# Altium footprint library std-th.PcbLib: 171 footprints (part 7 of 11)
Each footprint in its own frame and in the unit in brackets; x right, y up, seen from the top. Pads: shape width x height; smd on the part's side, far side on the other; paste and mask are expansions set on the pad; w line width, h text height; cw(c..) or ccw(c..) is an arc to the next point about the centre after c.
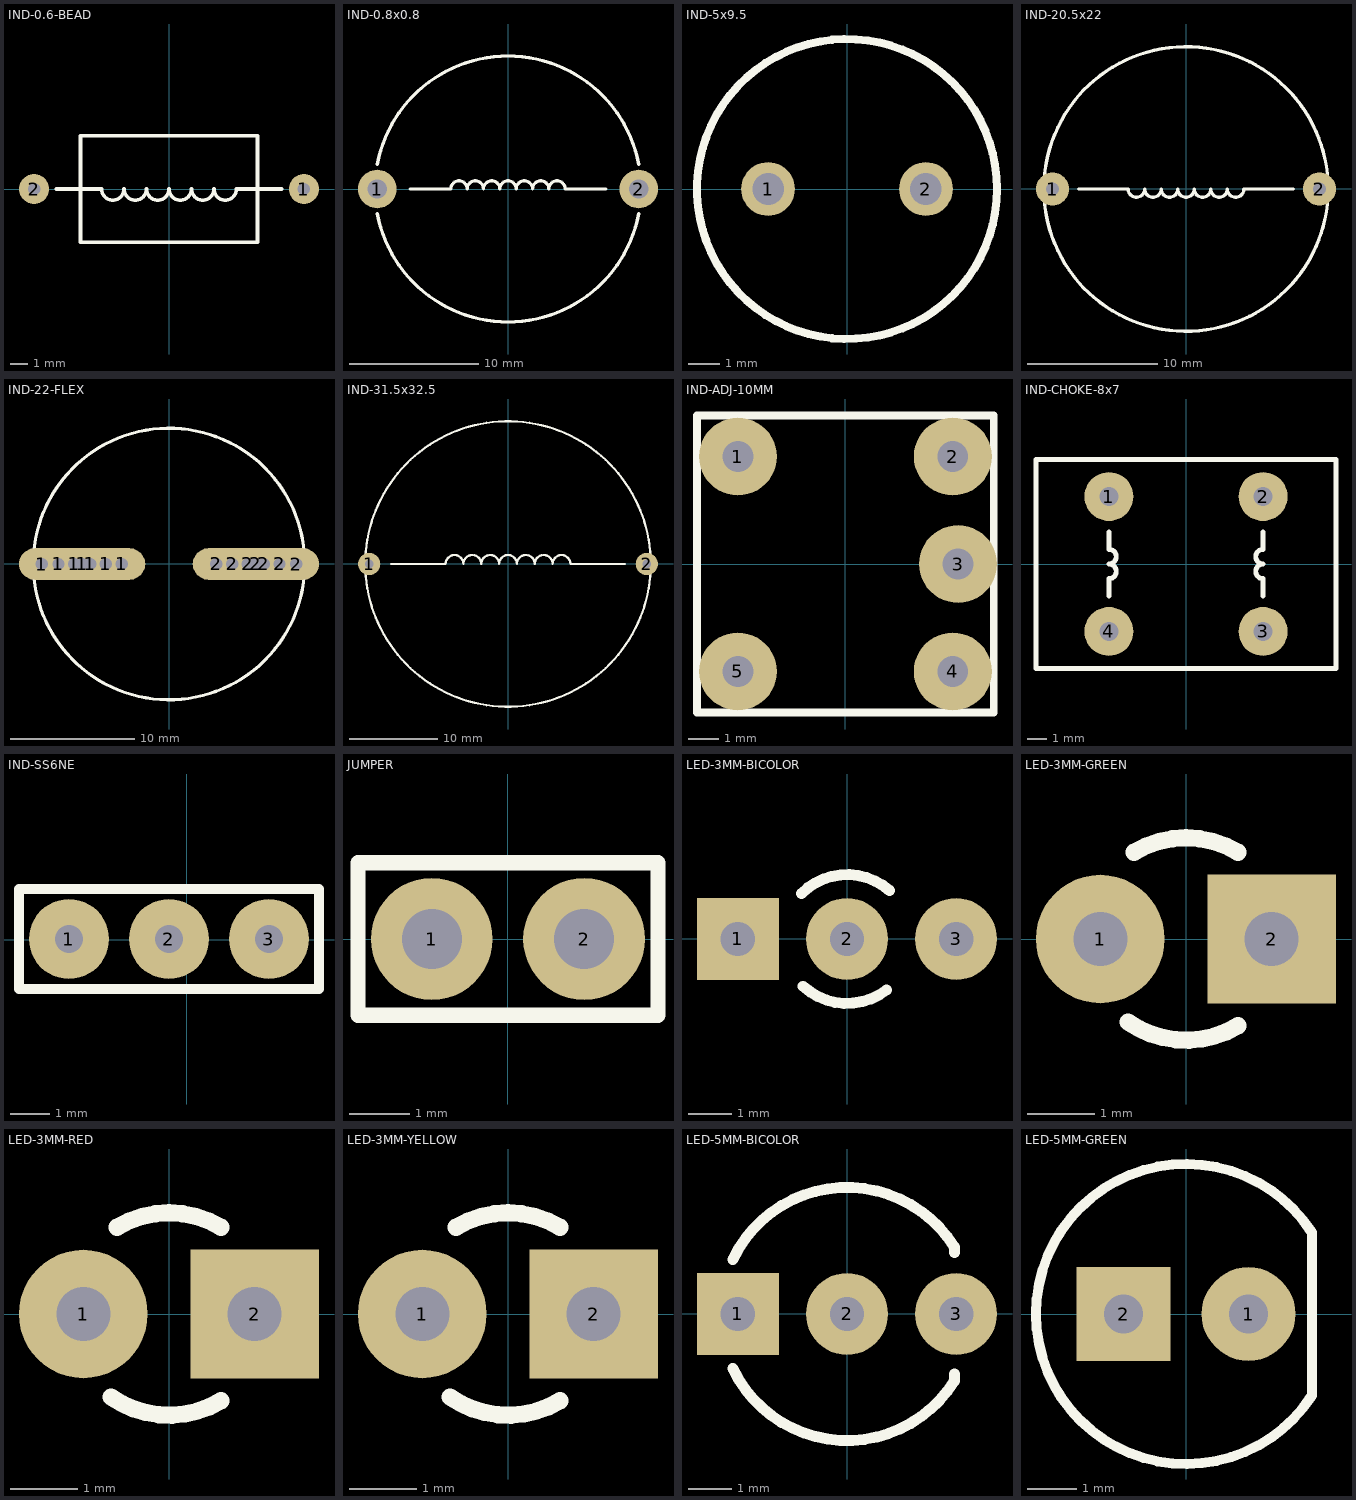
[diagram p6: the footprints below, top view; thin cyan lines are the x and y axes]

## IND-0.6-BEAD [mm] "Ferrite bead, 2 leads, 600 mil spacing, 10 mm length, 6 mm diameter"
height 6
pads (2):
  round 1.7 hole 0.7: 1(7.62,0) 2(-7.62,0)
Top Overlay:
  lines w0.203: -6.35,0 -3.81,0 ccw(c-3.175,0) -2.54,0 ccw(c-1.905,0) -1.27,0 ccw(c-0.635,0) 0,0 ccw(c0.635,0) 1.27,0 ccw(c1.905,0) 2.54,0 ccw(c3.175,0) 3.81,0 6.35,0 ; -5,-3 5,-3 5,3 -5,3 -5,-3
3D body "ferrite-bead.step": height 6, standoff -3.05, extent -7.875,-3 7.876,3

## IND-0.8x0.8 [mm] "Inductor, high current, 20 mm pitch"
height 20
pads (2):
  round 3 hole 1.5: 1(-10.16,0) 2(10.16,0)
Top Overlay:
  lines w0.254: -10.16,-1.905 ccw(c0,0) 10.16,-1.905 ; -10.16,1.905 cw(c0,0) 10.16,1.905 ; -7.62,0 -4.445,0 cw(c-3.81,0) -3.175,0 cw(c-2.54,0) -1.905,0 cw(c-1.27,0) -0.635,0 cw(c0,0) 0.635,0 cw(c1.27,0) 1.905,0 cw(c2.54,0) 3.175,0 cw(c3.81,0) 4.445,0 7.62,0
3D body "User Library-INDUCTOR - 2100HT series.step": height 11.43, standoff -12.7, extent -10.922,-10.922 10.922,10.922

## IND-5x9.5 [mm] "Inductor, 2 leads, 5 mm spacing, 9.5 mm diameter"
height 9
pads (2):
  round 1.7 hole 1: 1(-2.5,0) 2(2.5,0)
Top Overlay:
  circle w0.254: c0,0 r4.75
3D body "ELC09D.step": height 8.93, standoff -3.07, extent -4.75,-4.75 4.75,4.75

## IND-20.5x22 [mm] "Inductor, 2 leads, 20.5 mm spacing, 22 mm diameter, 2100HT series"
height 10
pads (2):
  round 2.54 hole 1: 1(-10.249,0) 2(10.249,0)
Top Overlay:
  circle w0.254: c0,0 r10.922
  lines w0.254: -8.255,0 -4.445,0 ccw(c-3.81,0) -3.175,0 ccw(c-2.54,0) -1.905,0 ccw(c-1.27,0) -0.635,0 ccw(c0,0) 0.635,0 ccw(c1.27,0) 1.905,0 ccw(c2.54,0) 3.175,0 ccw(c3.81,0) 4.445,0 8.255,0
3D body "User Library-INDUCTOR - 2100HT series.step": height 11.43, standoff -12.7, extent -10.922,-10.922 10.922,10.922

## IND-22-FLEX [mm] "Inductor, 2 leads, 22 mm diameter, flexible pins"
height 10
pads (14):
  round 2.54 hole 1: 1(-10.249,0) 1(-8.89,0) 1(-7.62,0) 1(-6.35,0) 1(-5.08,0) 1(-3.81,0) 2(3.81,0) 2(5.08,0) 2(6.35,0) 2(7.62,0) 2(8.89,0) 2(10.249,0)
  oval 10.16x2.54 hole 1: 1(-6.985,0) 2(6.985,0)
Top Overlay:
  circle w0.254: c0,0 r10.922
  lines w0.254: -8.255,0 -4.445,0 ccw(c-3.81,0) -3.175,0 ; 3.175,0 ccw(c3.81,0) 4.445,0 8.255,0
3D body "User Library-INDUCTOR - 2100HT series.step": height 11.43, standoff -12.7, extent -10.922,-10.922 10.922,10.922

## IND-31.5x32.5 [mm] "Inductor, 2 leads, 31.5 mm spacing, 32.5 mm diameter, 2200LL series"
pads (2):
  round 2.54 hole 1: 1(-15.824,0) 2(15.824,0)
Top Overlay:
  circle w0.254: c0,0 r16.269
  lines w0.254: -13.335,0 -7.112,0 cw(c-6.096,0) -5.08,0 cw(c-4.064,0) -3.048,0 cw(c-2.032,0) -1.016,0 cw(c0,0) 1.016,0 cw(c2.032,0) 3.048,0 cw(c4.064,0) 5.08,0 cw(c6.096,0) 7.112,0 13.335,0
3D body "User Library-toroid_2200LL-102-RC.step": height 15.66, standoff -12.7, extent -16.269,-16.214 16.269,16.215

## IND-ADJ-10MM [mm]
pads (5):
  round 2.54 hole 1: 1(-3.505,3.505) 2(3.505,3.505) 3(3.675,0) 4(3.505,-3.505) 5(-3.505,-3.505)
Top Overlay:
  lines w0.254: -4.84,-4.84 -4.84,4.84 4.84,4.84 4.84,-4.84 -4.84,-4.84
3D body "User Library-coilform001.step": height 12.9, standoff -3.35, extent -4.84,-4.84 4.84,4.84

## IND-CHOKE-8x7 [mm]
pads (4):
  round 2.54 hole 1: 1(-4,3.5) 2(4,3.5) 3(4,-3.5) 4(-4,-3.5)
Top Overlay:
  lines w0.254: -4,-1.651 -4,-0.762 ccw(c-4,-0.381) -4,0 ccw(c-4,0.381) -4,0.762 -4,1.651 ; 4,-1.651 4,-0.762 cw(c4,-0.381) 4,0 cw(c4,0.381) 4,0.762 4,1.651 ; -7.782,-5.425 -7.782,5.425 7.781,5.425 7.781,-5.425 -7.782,-5.425
3D body "User Library-INDUCTOR  COMMON MODE  22MH PER SIDE  WAH HING CG00008A.step": height 15.45, standoff -3, extent -7.782,-5.425 7.781,5.425

## IND-SS6NE [mil] "DSS6NE52A222Q55B Integrated line filter, 100 mil pitch"
height 196.85
pads (3):
  round 80 hole 27.56: 1(-117.83,0.66) 2(-17.83,0.66) 3(82.17,0.66)
Top Overlay:
  lines w10: -167.83,-49.25 -167.83,50.6 132.17,50.6 132.17,-49.25 -167.83,-49.25
3D body "User Library-FILTER_EMI_0349.step": height 281.9, standoff -62.17, extent -167.83,-49.25 132.17,50.6

## JUMPER [mil] "Jumper, 100 mil pitch"
height 314.96
pads (2):
  round 80 hole 39.37: 1(-50,0) 2(50,0)
Top Overlay:
  lines w10: -98.42,-49.99 98.43,-49.99 98.43,50.01 -98.42,50.01 -98.42,-49.99
3D body "SW3dPS-Jumper SL2.STEP": height 374.02, standoff -102.36, extent -98.42,-49.99 98.43,50.01

## LED-3MM-BICOLOR [mm] "Bicolor LED 3 mm"
height 5
pads (3):
  rect 1.905x1.905 hole 0.8: 1(-2.54,0)
  round 1.905 hole 0.8: 2(0,0) 3(2.54,0)
Top Overlay:
  lines w0.254: -1.061,1.061 cw(c0,0) 0.987,1.129 ; -1.02,-1.1 ccw(c0,0) 0.921,-1.184
3D body "User Library-LED RG.step": height 9.43, standoff -4, extent -2.25,-2 2.25,2

## LED-3MM-GREEN [mm] "LED, Green, 3 mm, 100 mil pitch"
height 6
pads (2):
  round 1.905 hole 0.8: 1(-1.27,0)
  rect 1.905x1.905 hole 0.8: 2(1.27,0)
Top Overlay:
  lines w0.254: -0.86,-1.229 ccw(c0,0) 0.772,-1.286 ; -0.772,1.286 cw(c0,0) 0.772,1.286
3D body "SW3dPS-LEDd3G.STEP": height 5.51, standoff -2.49, extent -1.664,-1.648 1.636,1.64

## LED-3MM-RED [mm] "LED, Red 3 mm, 100 mil pitch"
height 6
pads (2):
  round 1.905 hole 0.8: 1(-1.27,0)
  rect 1.905x1.905 hole 0.8: 2(1.27,0)
Top Overlay:
  lines w0.254: -0.86,-1.229 ccw(c0,0) 0.772,-1.286 ; -0.772,1.286 cw(c0,0) 0.772,1.286
3D body "SW3dPS-LEDd3R.STEP": height 5.51, standoff -2.49, extent -1.664,-1.648 1.636,1.64

## LED-3MM-YELLOW [mm] "LED, Yellow, 3 mm, 100 mil pitch"
height 6
pads (2):
  round 1.905 hole 0.8: 1(-1.27,0)
  rect 1.905x1.905 hole 0.8: 2(1.27,0)
Top Overlay:
  lines w0.254: -0.86,-1.229 ccw(c0,0) 0.772,-1.286 ; -0.772,1.286 cw(c0,0) 0.772,1.286
3D body "SW3dPS-LEDd3Y.STEP": height 5.51, standoff -2.49, extent -1.664,-1.648 1.636,1.64

## LED-5MM-BICOLOR [mm] "Bi Color LED 5 mm"
pads (3):
  rect 1.905x1.905 hole 0.8: 1(-2.54,0)
  round 1.905 hole 0.8: 2(0,0) 3(2.54,0)
Top Overlay:
  lines w0.254: -2.66,-1.267 ccw(c0,0) 2.501,-1.557 2.501,-1.397 ; -2.661,1.267 cw(c0,0) 2.502,1.556 2.501,1.436
3D body "User Library-5mmBiColorLED.step": height 10.82, standoff -2.62, extent -2.947,-2.946 2.794,2.946

## LED-5MM-GREEN [mm] "Typical LED; green; 2 Leads, vertical"
height 8.636
pads (2):
  round 1.905 hole 0.8: 1(1.27,0)
  rect 1.905x1.905 hole 0.8: 2(-1.27,0)
Top Overlay:
  lines w0.203: 2.556,-1.661 cw(c0,0) 2.556,1.661 2.556,-1.661
3D body "LED.step": height 12.31, standoff -2.49, extent -2.98,-3.01 2.44,3.01